# Altium footprint library General_Lib.PcbLib: 729 footprints (part 43 of 46)
Each footprint in its own frame and in the unit in brackets; x right, y up, seen from the top. Pads: shape width x height; smd on the part's side, far side on the other; paste and mask are expansions set on the pad; w line width, h text height; cw(c..) or ccw(c..) is an arc to the next point about the centre after c.
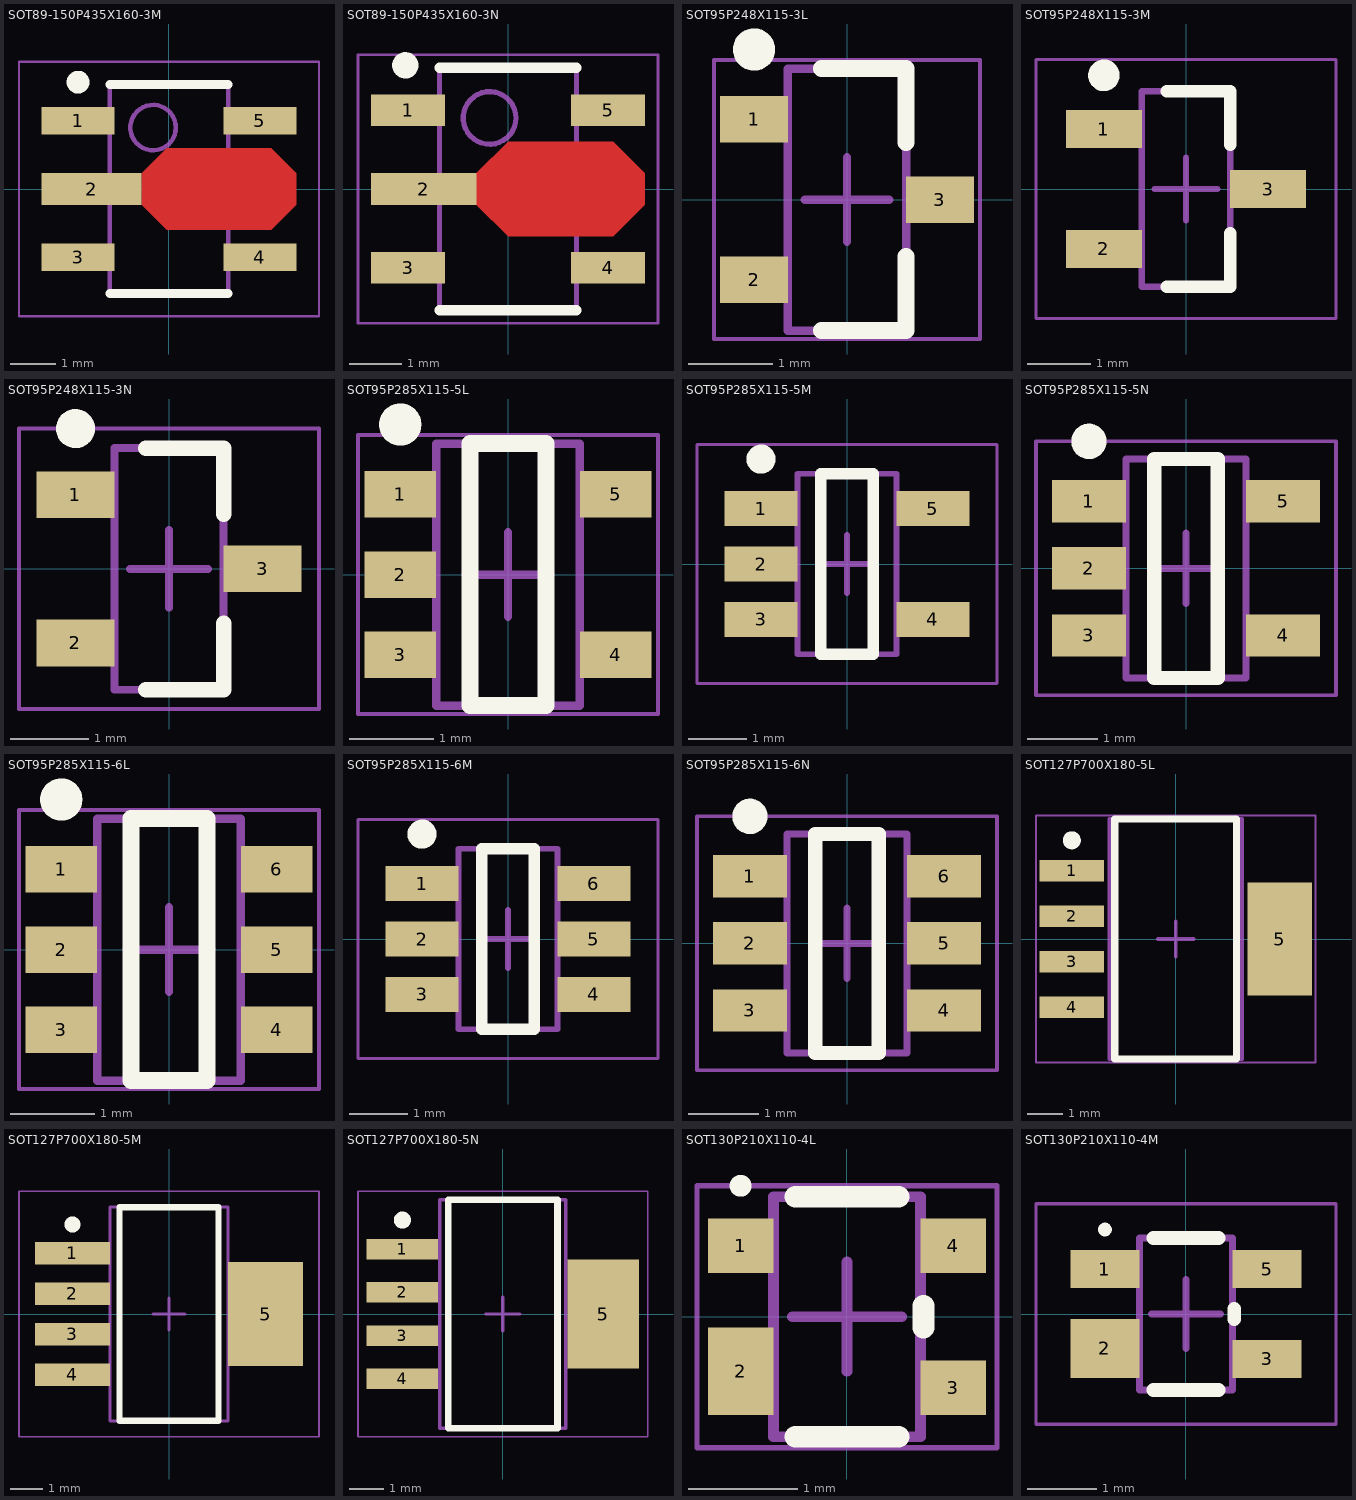
[diagram p42: the footprints below, top view; thin cyan lines are the x and y axes]

## SOT89-150P435X160-3M [mm] "SOT89, 3-Leads, Body 4,50x2,45mm, Pitch 1,50mm, Lead Span 4,4mm, IPC Low Density"
height 1.6
pads (5):
  rect 1.6x0.6 smd: 1(-2,1.5) 3(-2,-1.5) 4(2,-1.5) 5(2,1.5)
  rect 2.2x0.7 smd: 2(-1.7,0)
Top Layer:
  region: -0.6,0.35 -0.05,0.9 2.25,0.9 2.8,0.35 2.8,-0.35 2.25,-0.9 -0.05,-0.9 -0.6,-0.35
Top Overlay:
  circle w0.25: c-2,2.35 r0.125
  lines w0.2: -1.3,-2.3 1.3,-2.3 ; -1.3,2.3 1.3,2.3
Mechanical 13:
  circle w0.1: c-0.35,1.35 r0.5
  lines w0.1: -1.3,-2.3 1.3,-2.3 1.3,2.3 -1.3,2.3 -1.3,-2.3
Mechanical 15:
  lines w0.05: -3.3,-2.8 3.3,-2.8 3.3,2.8 -3.3,2.8 -3.3,-2.8
  lines w0.1: -0.5,0 0.5,0 ; 0,-0.5 0,0.5
3D body "SOT89-150P435X160-3M.step": height 1.6, standoff 0, extent -2.2,-2.3 1.85,2.3

## SOT89-150P435X160-3N [mm] "SOT89, 3-Leads, Body 4,50x2,45mm, Pitch 1,50mm, Lead Span 4,4mm, IPC Medium Density"
height 1.6
pads (5):
  rect 1.4x0.6 smd: 1(-1.9,1.5) 3(-1.9,-1.5) 4(1.9,-1.5) 5(1.9,1.5)
  rect 2x0.6 smd: 2(-1.6,0)
Top Layer:
  region: -0.6,0.3 0,0.9 2,0.9 2.6,0.3 2.6,-0.3 2,-0.9 0,-0.9 -0.6,-0.3
Top Overlay:
  circle w0.25: c-1.95,2.35 r0.125
  lines w0.2: -1.3,-2.3 1.3,-2.3 ; -1.3,2.3 1.3,2.3
Mechanical 13:
  circle w0.1: c-0.35,1.35 r0.5
  lines w0.1: -1.3,-2.3 1.3,-2.3 1.3,2.3 -1.3,2.3 -1.3,-2.3
Mechanical 15:
  lines w0.05: -2.85,-2.55 2.85,-2.55 2.85,2.55 -2.85,2.55 -2.85,-2.55
  lines w0.1: -0.5,0 0.5,0 ; 0,-0.5 0,0.5
3D body "SOT89-150P435X160-3N.step": height 1.6, standoff 0, extent -2.2,-2.3 1.85,2.3

## SOT95P248X115-3L [mm] "SOT23, 3-Leads, Body 2,95x2,48mm, Pitch 0,95mm, IPC High Density"
height 1.15
pads (3):
  rect 0.8x0.55 smd: 1(-1.1,0.95) 2(-1.1,-0.95) 3(1.1,0)
Top Overlay:
  circle w0.25: c-1.1,1.775 r0.125
  lines w0.2: -0.3,-1.55 0.7,-1.55 0.7,-0.675 ; -0.3,1.55 0.7,1.55 0.7,0.675
Mechanical 13:
  lines w0.1: -0.7,-1.55 0.7,-1.55 0.7,1.55 -0.7,1.55 -0.7,-1.55
Mechanical 15:
  lines w0.05: -1.575,-1.65 1.575,-1.65 1.575,1.65 -1.575,1.65 -1.575,-1.65
  lines w0.1: -0.5,0 0.5,0 ; 0,-0.5 0,0.5
3D body "SOT95P248X115-3L.step": height 1.15, standoff 0, extent -1.3,-1.55 1.3,1.55

## SOT95P248X115-3M [mm] "SOT23, 3-Leads, Body 2,95x2,48mm, Pitch 0,95mm, IPC Low Density"
height 1.15
pads (3):
  rect 1.2x0.6 smd: 1(-1.3,0.95) 2(-1.3,-0.95) 3(1.3,0)
Top Overlay:
  circle w0.25: c-1.3,1.8 r0.125
  lines w0.2: -0.3,-1.55 0.7,-1.55 0.7,-0.7 ; -0.3,1.55 0.7,1.55 0.7,0.7
Mechanical 13:
  lines w0.1: -0.7,-1.55 -0.7,1.55 0.7,1.55 0.7,-1.55 -0.7,-1.55
Mechanical 15:
  lines w0.05: -2.375,-2.05 -2.375,2.05 2.375,2.05 2.375,-2.05 -2.375,-2.05
  lines w0.1: -0.5,0 0.5,0 ; 0,-0.5 0,0.5
3D body "SOT95P248X115-3M.step": height 1.15, standoff 0, extent -1.3,-1.55 1.3,1.55

## SOT95P248X115-3N [mm] "SOT23, 3-Leads, Body 2,95x2,48mm, Pitch 0,95mm, IPC Medium Density"
height 1.15
pads (3):
  rect 1x0.6 smd: 1(-1.2,0.95) 2(-1.2,-0.95) 3(1.2,0)
Top Overlay:
  circle w0.25: c-1.2,1.8 r0.125
  lines w0.2: -0.3,-1.55 0.7,-1.55 0.7,-0.7 ; -0.3,1.55 0.7,1.55 0.7,0.7
Mechanical 13:
  lines w0.1: -0.7,-1.55 -0.7,1.55 0.7,1.55 0.7,-1.55 -0.7,-1.55
Mechanical 15:
  lines w0.05: -1.925,-1.8 -1.925,1.8 1.925,1.8 1.925,-1.8 -1.925,-1.8
  lines w0.1: -0.5,0 0.5,0 ; 0,-0.5 0,0.5
3D body "SOT95P248X115-3N.step": height 1.15, standoff 0, extent -1.3,-1.55 1.3,1.55

## SOT95P285X115-5L [mm] "SOT23, 5-Leads, Body 2,95x2,85mm, Pitch 0,95mm, IPC High Density"
height 1.15
pads (5):
  rect 0.85x0.55 smd: 1(-1.275,0.95) 2(-1.275,0) 3(-1.275,-0.95) 4(1.275,-0.95) 5(1.275,0.95)
Top Overlay:
  circle w0.25: c-1.275,1.775 r0.125
  lines w0.2: -0.45,-1.55 -0.45,1.55 0.45,1.55 0.45,-1.55 -0.45,-1.55
Mechanical 13:
  lines w0.1: -0.85,-1.55 0.85,-1.55 0.85,1.55 -0.85,1.55 -0.85,-1.55
Mechanical 15:
  lines w0.05: -1.775,-1.65 1.775,-1.65 1.775,1.65 -1.775,1.65 -1.775,-1.65
  lines w0.1: -0.5,0 0.5,0 ; 0,-0.5 0,0.5
3D body "SOT95P285X115-5L.step": height 1.15, standoff 0, extent -1.5,-1.55 1.5,1.55

## SOT95P285X115-5M [mm] "SOT23, 5-Leads, Body 2,95x2,85mm, Pitch 0,95mm, IPC Low Density"
height 1.15
pads (5):
  rect 1.25x0.6 smd: 1(-1.475,0.95) 2(-1.475,0) 3(-1.475,-0.95) 4(1.475,-0.95) 5(1.475,0.95)
Top Overlay:
  circle w0.25: c-1.475,1.8 r0.125
  lines w0.2: -0.45,-1.55 0.45,-1.55 0.45,1.55 -0.45,1.55 -0.45,-1.55
Mechanical 13:
  lines w0.1: -0.85,-1.55 -0.85,1.55 0.85,1.55 0.85,-1.55 -0.85,-1.55
Mechanical 15:
  lines w0.05: -2.575,-2.05 -2.575,2.05 2.575,2.05 2.575,-2.05 -2.575,-2.05
  lines w0.1: -0.5,0 0.5,0 ; 0,-0.5 0,0.5
3D body "SOT95P285X115-5M.step": height 1.15, standoff 0, extent -1.5,-1.55 1.5,1.55

## SOT95P285X115-5N [mm] "SOT23, 5-Leads, Body 2,95x2,85mm, Pitch 0,95mm, IPC Medium Density"
height 1.15
pads (5):
  rect 1.05x0.6 smd: 1(-1.375,0.95) 2(-1.375,0) 3(-1.375,-0.95) 4(1.375,-0.95) 5(1.375,0.95)
Top Overlay:
  circle w0.25: c-1.375,1.8 r0.125
  lines w0.2: -0.45,-1.55 0.45,-1.55 0.45,1.55 -0.45,1.55 -0.45,-1.55
Mechanical 13:
  lines w0.1: -0.85,-1.55 -0.85,1.55 0.85,1.55 0.85,-1.55 -0.85,-1.55
Mechanical 15:
  lines w0.05: -2.125,-1.8 -2.125,1.8 2.125,1.8 2.125,-1.8 -2.125,-1.8
  lines w0.1: -0.5,0 0.5,0 ; 0,-0.5 0,0.5
3D body "SOT95P285X115-5N.step": height 1.15, standoff 0, extent -1.5,-1.55 1.5,1.55

## SOT95P285X115-6L [mm] "SOT23, 6-Leads, Body 2,95x2,85mm, Pitch 0,95mm, IPC High Density"
height 1.15
pads (6):
  rect 0.85x0.55 smd: 1(-1.275,0.95) 2(-1.275,0) 3(-1.275,-0.95) 4(1.275,-0.95) 5(1.275,0) 6(1.275,0.95)
Top Overlay:
  circle w0.25: c-1.275,1.775 r0.125
  lines w0.2: -0.45,-1.55 -0.45,1.55 0.45,1.55 0.45,-1.55 -0.45,-1.55
Mechanical 13:
  lines w0.1: -0.85,-1.55 0.85,-1.55 0.85,1.55 -0.85,1.55 -0.85,-1.55
Mechanical 15:
  lines w0.05: -1.775,-1.65 1.775,-1.65 1.775,1.65 -1.775,1.65 -1.775,-1.65
  lines w0.1: -0.5,0 0.5,0 ; 0,-0.5 0,0.5
3D body "SOT95P285X115-6L.step": height 1.15, standoff 0, extent -1.5,-1.55 1.5,1.55

## SOT95P285X115-6M [mm] "SOT23, 6-Leads, Body 2,95x2,85mm, Pitch 0,95mm, IPC Low Density"
height 1.15
pads (6):
  rect 1.25x0.6 smd: 1(-1.475,0.95) 2(-1.475,0) 3(-1.475,-0.95) 4(1.475,-0.95) 5(1.475,0) 6(1.475,0.95)
Top Overlay:
  circle w0.25: c-1.475,1.8 r0.125
  lines w0.2: -0.45,-1.55 0.45,-1.55 0.45,1.55 -0.45,1.55 -0.45,-1.55
Mechanical 13:
  lines w0.1: -0.85,-1.55 -0.85,1.55 0.85,1.55 0.85,-1.55 -0.85,-1.55
Mechanical 15:
  lines w0.05: -2.575,-2.05 -2.575,2.05 2.575,2.05 2.575,-2.05 -2.575,-2.05
  lines w0.1: -0.5,0 0.5,0 ; 0,-0.5 0,0.5
3D body "SOT95P285X115-6M.step": height 1.15, standoff 0, extent -1.5,-1.55 1.5,1.55

## SOT95P285X115-6N [mm] "SOT23, 6-Leads, Body 2,95x2,85mm, Pitch 0,95mm, IPC Medium Density"
height 1.15
pads (6):
  rect 1.05x0.6 smd: 1(-1.375,0.95) 2(-1.375,0) 3(-1.375,-0.95) 4(1.375,-0.95) 5(1.375,0) 6(1.375,0.95)
Top Overlay:
  circle w0.25: c-1.375,1.8 r0.125
  lines w0.2: -0.45,-1.55 -0.45,1.55 0.45,1.55 0.45,-1.55 -0.45,-1.55
Mechanical 13:
  lines w0.1: -0.85,-1.55 0.85,-1.55 0.85,1.55 -0.85,1.55 -0.85,-1.55
Mechanical 15:
  lines w0.05: -2.125,-1.8 2.125,-1.8 2.125,1.8 -2.125,1.8 -2.125,-1.8
  lines w0.1: -0.5,0 0.5,0 ; 0,-0.5 0,0.5
3D body "SOT95P285X115-6N.step": height 1.15, standoff 0, extent -1.5,-1.55 1.5,1.55

## SOT127P700X180-5L [mm] "SOT223, 5-Leads, Body 6,50x7,00mm (avg), Pitch 1,27mm, IPC High Density"
height 1.8
pads (5):
  rect 1.8x0.6 smd: 1(-2.9,1.905) 2(-2.9,0.635) 3(-2.9,-0.635) 4(-2.9,-1.905)
  rect 1.8x3.15 smd: 5(2.9,0)
Top Overlay:
  circle w0.25: c-2.9,2.755 r0.125
  lines w0.2: -1.7,-3.35 -1.7,3.35 1.7,3.35 1.7,-3.35 -1.7,-3.35
Mechanical 13:
  lines w0.1: -1.85,-3.35 -1.85,3.35 1.85,3.35 1.85,-3.35 -1.85,-3.35
Mechanical 15:
  lines w0.05: -3.9,-3.45 -3.9,3.45 3.9,3.45 3.9,-3.45 -3.9,-3.45
  lines w0.1: -0.5,0 0.5,0 ; 0,-0.5 0,0.5
3D body "SOT127P700X180-5L.step": height 1.8, standoff 0, extent -3.5,-3.35 3.5,3.35

## SOT127P700X180-5M [mm] "SOT223, 5-Leads, Body 6,50x7,00mm (avg), Pitch 1,27mm, IPC Low Density"
height 1.8
pads (5):
  rect 2.35x0.7 smd: 1(-3.025,1.905) 2(-3.025,0.635) 3(-3.025,-0.635) 4(-3.025,-1.905)
  rect 2.35x3.25 smd: 5(3.025,0)
Top Overlay:
  circle w0.25: c-3.025,2.805 r0.125
  lines w0.2: -1.55,-3.35 1.55,-3.35 1.55,3.35 -1.55,3.35 -1.55,-3.35
Mechanical 13:
  lines w0.1: -1.85,-3.35 1.85,-3.35 1.85,3.35 -1.85,3.35 -1.85,-3.35
Mechanical 15:
  lines w0.05: -4.7,-3.85 4.7,-3.85 4.7,3.85 -4.7,3.85 -4.7,-3.85
  lines w0.1: -0.5,0 0.5,0 ; 0,-0.5 0,0.5
3D body "SOT127P700X180-5M.step": height 1.8, standoff 0, extent -3.5,-3.35 3.5,3.35

## SOT127P700X180-5N [mm] "SOT223, 5-Leads, Body 6,50x7,00mm (avg), Pitch 1,27mm, IPC Medium Density"
height 1.8
pads (5):
  rect 2.1x0.6 smd: 1(-2.95,1.905) 2(-2.95,0.635) 3(-2.95,-0.635) 4(-2.95,-1.905)
  rect 2.1x3.2 smd: 5(2.95,0)
Top Overlay:
  circle w0.25: c-2.95,2.755 r0.125
  lines w0.2: -1.6,-3.35 -1.6,3.35 1.6,3.35 1.6,-3.35 -1.6,-3.35
Mechanical 13:
  lines w0.1: -1.85,-3.35 -1.85,3.35 1.85,3.35 1.85,-3.35 -1.85,-3.35
Mechanical 15:
  lines w0.05: -4.25,-3.6 -4.25,3.6 4.25,3.6 4.25,-3.6 -4.25,-3.6
  lines w0.1: -0.5,0 0.5,0 ; 0,-0.5 0,0.5
3D body "SOT127P700X180-5N.step": height 1.8, standoff 0, extent -3.5,-3.35 3.5,3.35

## SOT130P210X110-4L [mm] "SOT343, 4-Leads, Body 2,00x2,10mm, Pitch 1,30mm, IPC High Density"
height 1.1
pads (4):
  rect 0.6x0.5 smd: 1(-0.975,0.65) 3(0.975,-0.65) 4(0.975,0.65)
  rect 0.6x0.8 smd: 2(-0.975,-0.5)
Top Overlay:
  circle w0.1: c-0.975,1.2 r0.05
  lines w0.2: -0.475,-1.1 0.475,-1.1 ; -0.475,1.1 0.475,1.1 ; 0.7,-0.1 0.7,0.1
Mechanical 13:
  lines w0.1: -0.675,-1.1 0.675,-1.1 0.675,1.1 -0.675,1.1 -0.675,-1.1
Mechanical 15:
  lines w0.05: -1.375,-1.2 1.375,-1.2 1.375,1.2 -1.375,1.2 -1.375,-1.2
  lines w0.1: -0.5,0 0.5,0 ; 0,-0.5 0,0.5
3D body "SOT130P210X110-4L.step": height 1.1, standoff 0, extent -1.225,-1.1 1.225,1.1

## SOT130P210X110-4M [mm] "SOT343, 4-Leads, Body 2,00x2,10mm, Pitch 1,30mm, IPC Low Density"
height 1.1
pads (4):
  rect 1x0.55 smd: 1(-1.175,0.65) 3(1.175,-0.65) 5(1.175,0.65)
  rect 1x0.85 smd: 2(-1.175,-0.5)
Top Overlay:
  circle w0.1: c-1.175,1.225 r0.05
  lines w0.2: -0.475,-1.1 0.475,-1.1 ; -0.475,1.1 0.475,1.1 ; 0.7,-0.075 0.7,0.075
Mechanical 13:
  lines w0.1: -0.675,-1.1 0.675,-1.1 0.675,1.1 -0.675,1.1 -0.675,-1.1
Mechanical 15:
  lines w0.05: -2.175,-1.6 2.175,-1.6 2.175,1.6 -2.175,1.6 -2.175,-1.6
  lines w0.1: -0.5,0 0.5,0 ; 0,-0.5 0,0.5
3D body "SOT130P210X110-4M.step": height 1.1, standoff 0, extent -1.225,-1.1 1.225,1.1